# Altium footprint library MyPcbLib.PcbLib: 657 footprints (part 20 of 42)
Each footprint in its own frame and in the unit in brackets; x right, y up, seen from the top. Pads: shape width x height; smd on the part's side, far side on the other; paste and mask are expansions set on the pad; w line width, h text height; cw(c..) or ccw(c..) is an arc to the next point about the centre after c.
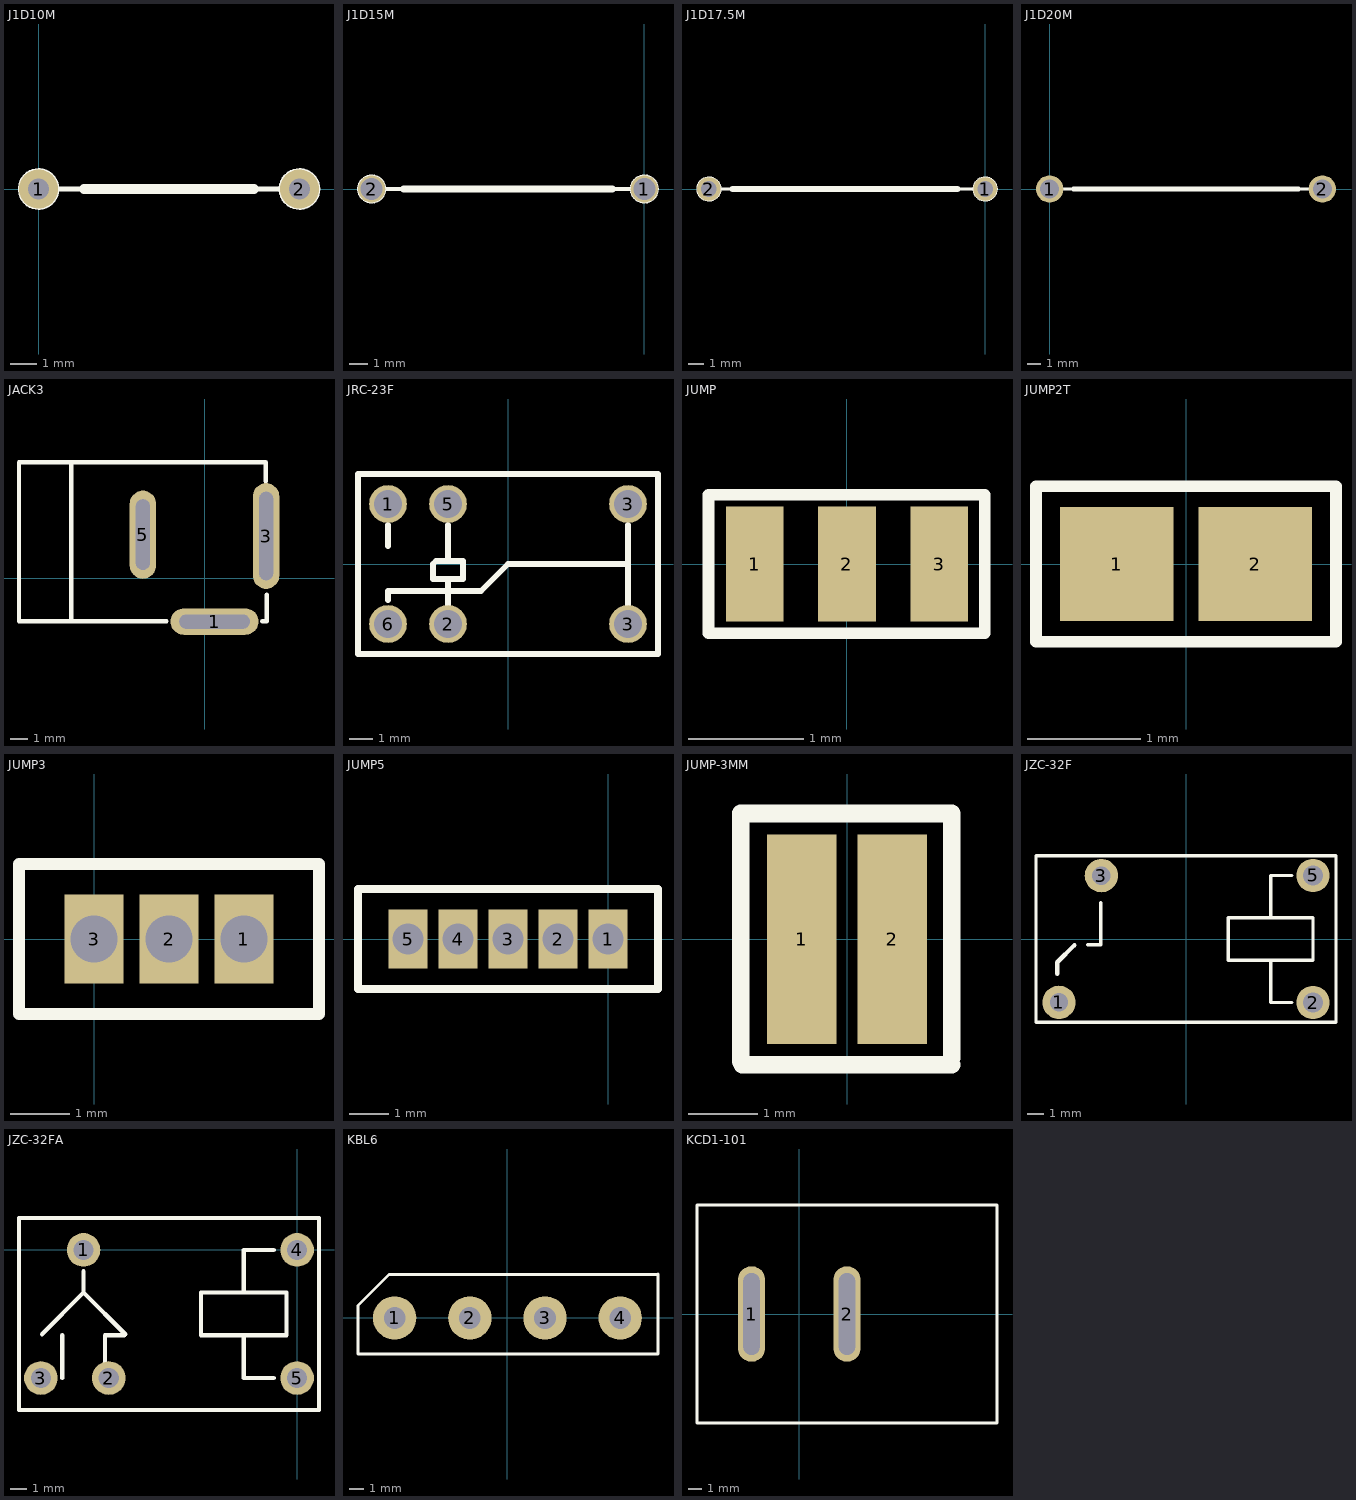
[diagram p19: the footprints below, top view; thin cyan lines are the x and y axes]

## J1D10M [mm]
pads (2):
  round 1.5 / inner round 1.5 / far side round 1.8 hole 0.8: 1(0,0)
  round 1.5 / inner round 1.5 / far side oval 1.8x1.4 hole 0.8: 2(10,0)
Top Overlay:
  circle w0.2: c0,0 r0.7
  circle w0.2: c10,0 r0.7
  lines w0.2: 0.7,0 9.25,0
  lines w0.4: 1.75,0 8.25,0

## J1D15M [mm]
pads (2):
  round 1.5 / inner round 1.5 / far side round 2.2 hole 1.2: 1(0,0) 2(-15,0)
Top Overlay:
  circle w0.2: c-15,0 r0.7
  circle w0.2: c0,0 r0.7
  lines w0.2: -14.3,0 -0.75,0
  lines w0.4: -13.25,0 -1.75,0

## J1D17.5M [mm]
pads (2):
  round 1.5 / inner round 1.5 / far side round 2.2 hole 1: 1(0,0) 2(-17.5,0)
Top Overlay:
  circle w0.2: c-17.5,0 r0.7
  circle w0.2: c0,0 r0.7
  lines w0.2: -17.5,0 -0.75,0
  lines w0.4: -16,0 -1.75,0

## J1D20M [mm]
pads (2):
  round 2 hole 1.4: 1(0,0) 2(20,0)
Top Overlay:
  circle w0.2: c20,0 r0.7
  circle w0.2: c0,0 r0.7
  lines w0.2: 0.7,0 19.25,0
  lines w0.4: 1.75,0 18.25,0

## JACK3 [mm]
pads (3):
  oval 5x1.5 hole 0.8 slot 4 at 0 deg: 1(0.572,-2.464)
  oval 1.5x6 hole 0.8 slot 5 at 90 deg: 3(3.492,2.388)
  oval 1.5x5 hole 0.8 slot 4 at 90 deg: 5(-3.492,2.464)
Top Overlay:
  lines w0.254: -7.569,-2.435 -7.569,6.565 ; -2.155,-2.435 -10.52,-2.435 -10.52,6.565 3.48,6.565 3.48,5.486 ; 3.273,-2.435 3.528,-2.435 3.528,-0.943
3D body: height 11, standoff -3, extent -10.33,-2.392 3.67,6.608

## JRC-23F [mm]
pads (6):
  round 1.6 hole 1.2: 1(-5.08,2.54) 2(-2.54,-2.54) 3(5.08,-2.54) 3(5.08,2.54) 5(-2.54,2.54) 6(-5.08,-2.54)
Top Overlay:
  lines w0.254: -5.08,-1.524 -5.08,-1.143 -1.143,-1.143 0,0 5.08,0 ; -5.08,0.762 -5.08,1.651 ; -2.54,-1.778 -2.54,-0.762 ; -2.54,0.127 -2.54,0.635 -2.54,1.651 ; 5.08,-1.778 5.08,1.651 ; -6.35,-3.81 -6.35,3.81 6.35,3.81 6.35,-3.81 -6.35,-3.81 ; -3.175,-0.635 -3.175,0 -3.048,0.127 -1.905,0.127 -1.905,-0.635 -3.175,-0.635
3D body: height 10.45, standoff -2.75, extent -6.529,-3.715 5.971,3.785

## JUMP [mm]
pads (3):
  rect 0.5x1 smd: 1(-0.8,0) 2(0,0) 3(0.8,0)
Top Overlay:
  lines w0.102: -1.2,-0.6 1.194,-0.6 1.194,0.6 -1.2,0.6 -1.2,-0.6

## JUMP2T [mm]
pads (2):
  rect 1x1 smd: 1(-0.61,0) 2(0.61,0)
Top Overlay:
  lines w0.102: -1.321,-0.686 1.321,-0.686 1.321,0.686 -1.321,0.686 -1.321,-0.686

## JUMP3 [mm]
pads (3):
  rect 1x1.5 hole 0.8: 1(2.54,0) 2(1.27,0) 3(0,0)
Top Overlay:
  lines w0.203: -1.27,-1.27 -1.27,1.27 3.81,1.27 3.81,-1.27 -1.27,-1.27

## JUMP5 [mm]
pads (5):
  rect 1x1.5 hole 0.8: 1(0,0) 2(-1.27,0) 3(-2.54,0) 4(-3.81,0) 5(-5.08,0)
Top Overlay:
  lines w0.203: -6.35,-1.27 1.27,-1.27 1.27,1.27 -6.35,1.27 -6.35,-1.27

## JUMP-3MM [mm]
pads (2):
  rect 1x3 smd: 1(-0.65,0) 2(0.65,0)
Top Overlay:
  lines w0.254: -1.524,-1.753 -1.524,1.803 ; -1.5,-1.8 1.5,-1.8 ; -1.5,1.8 1.5,1.8 ; 1.5,-1.702 1.5,1.778

## JZ-5032 [mm]

## JZC-32F [mm]
pads (4):
  round 2 hole 1.1: 1(-7.62,-3.8) 3(-5.08,3.8)
  round 2 hole 1.2: 2(7.62,-3.81) 5(7.62,3.81)
Top Overlay:
  lines w0.203: -5.893,-0.356 -5.105,-0.356 -5.105,0.914 -5.105,2.184 ; 5.08,-1.27 5.08,-3.81 6.35,-3.81 ; 5.08,1.27 5.08,3.81 6.35,3.81 ; 9,-5 -9,-5 -9,5 9,5 9,-4.97 ; 2.54,-1.27 2.54,1.27 7.62,1.27 7.62,-1.27 2.54,-1.27
  lines w0.254: -7.722,-2.083 -7.722,-1.397 -6.693,-0.368
3D body: height 1.5, standoff -15.5, extent -8.761,-5.279 8.839,4.821

## JZC-32FA [mm]
pads (5):
  round 2 hole 1.2: 1(-12.7,0) 2(-11.2,-7.62) 3(-15.24,-7.62) 4(0,0) 5(0,-7.62)
Top Overlay:
  lines w0.254: -15.176,-5.016 -12.7,-2.54 ; -13.97,-7.62 -13.97,-5.08 ; -12.7,-1.27 -12.7,-2.54 ; -11.43,-7.62 -11.43,-5.08 -10.287,-5.08 -10.223,-5.016 -12.7,-2.54 ; -3.175,-5.08 -3.175,-7.62 -1.397,-7.62 ; -3.175,-2.54 -3.175,0 -1.397,0 ; -16.54,-9.525 1.3,-9.525 1.3,1.9 -16.54,1.9 -16.54,-9.525 ; -5.715,-5.08 -0.635,-5.08 -0.635,-2.54 -5.715,-2.54 -5.715,-5.08
3D body: height 15, standoff -2, extent -16.42,-9.033 1.18,1.067

## KBL6 [mm]
pads (4):
  round 3 hole 1.5: 1(-7.8,0) 2(-2.6,0) 3(2.6,0) 4(7.8,0)
Top Overlay:
  lines w0.203: -10.338,-2.5 10.414,-2.5 ; -10.338,-2.438 -10.338,0.864 -8.201,3 10.414,3 ; 10.414,-2.464 10.414,3.048

## KCD1-101 [mm]
pads (2):
  oval 2x7 hole 1.2 slot 6 at 90 deg: 1(-3.5,0) 2(3.5,0)
Top Overlay:
  lines w0.203: -7.5,-8 14.5,-8 14.5,8 -7.5,8 -7.5,-8
3D body: height 18.22, standoff -3.1, extent -6.934,-7.449 14.159,7.551